# Altium footprint library Modules.PcbLib: 11 footprints
Each footprint in its own frame and in the unit in brackets; x right, y up, seen from the top. Pads: shape width x height; smd on the part's side, far side on the other; paste and mask are expansions set on the pad; w line width, h text height; cw(c..) or ccw(c..) is an arc to the next point about the centre after c.
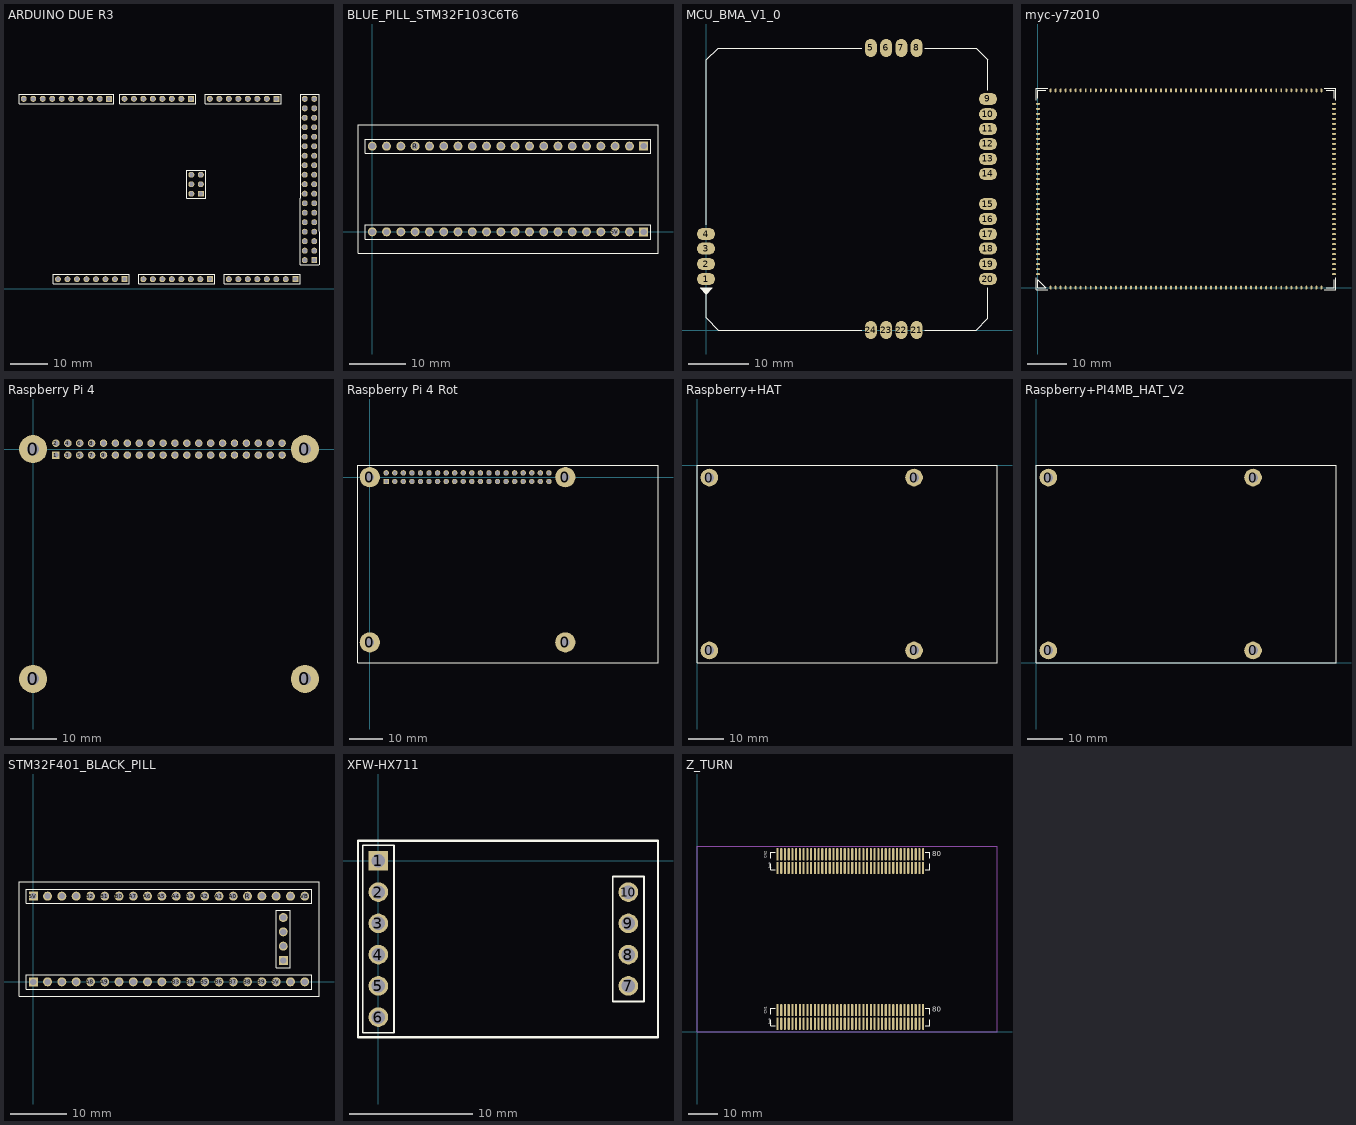
[diagram p0: the footprints below, top view; thin cyan lines are the x and y axes]

## ARDUINO DUE R3 [mm]
pads (92):
  rect 1.6x1.6 hole 1.1: 0(63.5,50.8) 8(41.656,50.8) 21(86.36,50.8) A7(68.58,2.54) CANTX(91.44,2.54) GND(66.167,25.4) GND(96.52,7.62) VIN(45.72,2.54)
  round 1.6 hole 1.1: 1(60.96,50.8) 2(58.42,50.8) 3(55.88,50.8) 3V3(35.56,2.54) 4(53.34,50.8) 5(50.8,50.8) 5V(38.1,2.54) 5V(66.167,30.48) 5V(93.98,50.8) 5V(96.52,50.8) 6(48.26,50.8) 7(45.72,50.8) 9(39.116,50.8) 10(36.576,50.8) 11(34.036,50.8) 12(31.496,50.8) 13(28.956,50.8) 14(68.58,50.8) 15(71.12,50.8) 16(73.66,50.8) 17(76.2,50.8) 18(78.74,50.8) 19(81.28,50.8) 20(83.82,50.8) 22(93.98,48.26) 23(96.52,48.26) 24(93.95,45.73) 25(96.49,45.73) 26(93.95,43.19) 27(96.49,43.19) 28(93.95,40.65) 29(96.49,40.65) 30(93.95,38.11) 31(96.49,38.11) 32(93.95,35.57) 33(96.49,35.57) 34(93.95,33.03) 35(96.49,33.03) 36(93.95,30.49) 37(96.49,30.49) 38(93.95,27.95) 39(96.49,27.95) 40(93.95,25.41) 41(96.49,25.41) 42(93.98,22.86) 43(96.52,22.86) 44(93.98,20.32) 45(96.52,20.32) 46(93.98,17.78) 47(96.52,17.78) 48(93.98,15.24) 49(96.52,15.24) 50(93.98,12.7) 51(96.52,12.7) 52(93.98,10.16) 53(96.52,10.16) A0(50.8,2.54) A1(53.34,2.54) A2(55.88,2.54) A3(58.42,2.54) A4(60.96,2.54) A5(63.5,2.54) A6(66.04,2.54) A8(73.66,2.54) A9(76.2,2.54) A10(78.74,2.54) A11(81.28,2.54) AREF(23.876,50.8) CANRX(88.9,2.54) DAC0(83.82,2.54) DAC1(86.36,2.54) GND(26.416,50.8) GND(40.64,2.54) GND(43.18,2.54) GND(93.98,7.62) IOREF(30.48,2.54) MISO(63.627,30.48) MOSI(66.167,27.94) NC(27.94,2.54) RESET(33.02,2.54) RESET(63.627,25.4) SCK(63.627,27.94) SCL1(18.796,50.8) SDA1(21.336,50.8)
Top Overlay:
  lines w0.15: 17.526,49.53 42.926,49.53 42.926,52.07 17.526,52.07 17.526,49.53 ; 26.67,1.27 26.67,3.81 46.99,3.81 46.99,1.27 26.67,1.27 ; 44.45,49.53 44.45,52.07 64.77,52.07 64.77,49.53 44.45,49.53 ; 49.53,1.27 49.53,3.81 69.85,3.81 69.85,1.27 49.53,1.27 ; 62.357,24.13 62.357,31.75 64.897,31.75 67.437,31.75 67.437,24.13 64.897,24.13 62.357,24.13 ; 67.31,49.53 67.31,52.07 87.63,52.07 87.63,49.53 67.31,49.53 ; 72.39,1.27 72.39,3.81 92.71,3.81 92.71,1.27 72.39,1.27 ; 92.71,6.35 97.79,6.35 97.79,24.13 97.79,41.91 97.79,52.07 92.71,52.07 92.71,41.91 92.71,24.13 92.71,6.35
Bottom Overlay:
  lines w0.15: 17.526,49.53 42.926,49.53 42.926,52.07 17.526,52.07 17.526,49.53 ; 26.67,1.27 46.99,1.27 46.99,3.81 26.67,3.81 26.67,1.27 ; 44.45,49.53 64.77,49.53 64.77,52.07 44.45,52.07 44.45,49.53 ; 49.53,1.27 69.85,1.27 69.85,3.81 49.53,3.81 49.53,1.27 ; 62.357,24.13 62.357,31.75 64.897,31.75 67.437,31.75 67.437,24.13 64.897,24.13 62.357,24.13 ; 67.31,49.53 87.63,49.53 87.63,52.07 67.31,52.07 67.31,49.53 ; 72.39,1.27 92.71,1.27 92.71,3.81 72.39,3.81 72.39,1.27 ; 92.71,6.35 97.79,6.35 97.79,24.13 97.79,41.91 97.79,52.07 92.71,52.07 92.71,41.91 92.71,24.13 92.71,6.35
3D body "User Library-DS1023.STEP": height 8.5, standoff -3, extent 64.897,24.13 67.437,26.67
3D body "User Library-DS1023.STEP": height 8.5, standoff -3, extent 64.897,26.67 67.437,29.21
3D body "User Library-DS1023.STEP": height 8.5, standoff -3, extent 64.897,29.21 67.437,31.75
3D body "User Library-DS1023.STEP": height 8.5, standoff -3, extent 62.357,24.13 64.897,26.67
3D body "User Library-DS1023.STEP": height 8.5, standoff -3, extent 62.357,26.67 64.897,29.21
3D body "User Library-DS1023.STEP": height 8.5, standoff -3, extent 62.357,29.21 64.897,31.75
3D body "User Library-ARDUINO DUE.STEP": height -1.4, standoff -16, extent -1.88,0 101.6,53.34
3D body "PLS-1.STEP": height 8.5, standoff -3, extent 67.31,49.53 69.85,52.07
3D body "PLS-1.STEP": height 8.5, standoff -3, extent 69.85,49.53 72.39,52.07
3D body "PLS-1.STEP": height 8.5, standoff -3, extent 72.39,49.53 74.93,52.07
3D body "PLS-1.STEP": height 8.5, standoff -3, extent 74.93,49.53 77.47,52.07
3D body "PLS-1.STEP": height 8.5, standoff -3, extent 77.47,49.53 80.01,52.07
3D body "PLS-1.STEP": height 8.5, standoff -3, extent 80.01,49.53 82.55,52.07
3D body "PLS-1.STEP": height 8.5, standoff -3, extent 82.55,49.53 85.09,52.07
3D body "PLS-1.STEP": height 8.5, standoff -3, extent 85.09,49.53 87.63,52.07
3D body "PLS-1.STEP": height 8.5, standoff -3, extent 26.67,1.27 29.21,3.81
3D body "PLS-1.STEP": height 8.5, standoff -3, extent 29.21,1.27 31.75,3.81
3D body "PLS-1.STEP": height 8.5, standoff -3, extent 31.75,1.27 34.29,3.81
3D body "PLS-1.STEP": height 8.5, standoff -3, extent 34.29,1.27 36.83,3.81
3D body "PLS-1.STEP": height 8.5, standoff -3, extent 36.83,1.27 39.37,3.81
3D body "PLS-1.STEP": height 8.5, standoff -3, extent 39.37,1.27 41.91,3.81
3D body "PLS-1.STEP": height 8.5, standoff -3, extent 41.91,1.27 44.45,3.81
3D body "PLS-1.STEP": height 8.5, standoff -3, extent 44.45,1.27 46.99,3.81
3D body "PLS-1.STEP": height 8.5, standoff -3, extent 44.45,49.53 46.99,52.07
3D body "PLS-1.STEP": height 8.5, standoff -3, extent 46.99,49.53 49.53,52.07
3D body "PLS-1.STEP": height 8.5, standoff -3, extent 49.53,49.53 52.07,52.07
3D body "PLS-1.STEP": height 8.5, standoff -3, extent 52.07,49.53 54.61,52.07
3D body "PLS-1.STEP": height 8.5, standoff -3, extent 54.61,49.53 57.15,52.07
3D body "PLS-1.STEP": height 8.5, standoff -3, extent 57.15,49.53 59.69,52.07
3D body "PLS-1.STEP": height 8.5, standoff -3, extent 59.69,49.53 62.23,52.07
3D body "PLS-1.STEP": height 8.5, standoff -3, extent 62.23,49.53 64.77,52.07
3D body "PLS-1.STEP": height 8.5, standoff -3, extent 49.53,1.27 52.07,3.81
3D body "PLS-1.STEP": height 8.5, standoff -3, extent 52.07,1.27 54.61,3.81
3D body "PLS-1.STEP": height 8.5, standoff -3, extent 54.61,1.27 57.15,3.81
3D body "PLS-1.STEP": height 8.5, standoff -3, extent 57.15,1.27 59.69,3.81
3D body "PLS-1.STEP": height 8.5, standoff -3, extent 59.69,1.27 62.23,3.81
3D body "PLS-1.STEP": height 8.5, standoff -3, extent 62.23,1.27 64.77,3.81
3D body "PLS-1.STEP": height 8.5, standoff -3, extent 64.77,1.27 67.31,3.81
3D body "PLS-1.STEP": height 8.5, standoff -3, extent 67.31,1.27 69.85,3.81
3D body "PLS-1.STEP": height 8.5, standoff -3, extent 72.39,1.27 74.93,3.81
3D body "PLS-1.STEP": height 8.5, standoff -3, extent 74.93,1.27 77.47,3.81
3D body "PLS-1.STEP": height 8.5, standoff -3, extent 77.47,1.27 80.01,3.81
3D body "PLS-1.STEP": height 8.5, standoff -3, extent 80.01,1.27 82.55,3.81
3D body "PLS-1.STEP": height 8.5, standoff -3, extent 82.55,1.27 85.09,3.81
3D body "PLS-1.STEP": height 8.5, standoff -3, extent 85.09,1.27 87.63,3.81
3D body "PLS-1.STEP": height 8.5, standoff -3, extent 87.63,1.27 90.17,3.81
3D body "PLS-1.STEP": height 8.5, standoff -3, extent 90.17,1.27 92.71,3.81
3D body "PLS-1.STEP": height 8.5, standoff -3, extent 92.71,39.37 95.25,41.91
3D body "PLS-1.STEP": height 8.5, standoff -3, extent 92.71,36.83 95.25,39.37
3D body "PLS-1.STEP": height 8.5, standoff -3, extent 92.71,34.29 95.25,36.83
3D body "PLS-1.STEP": height 8.5, standoff -3, extent 95.25,39.37 97.79,41.91
3D body "PLS-1.STEP": height 8.5, standoff -3, extent 95.25,36.83 97.79,39.37
3D body "PLS-1.STEP": height 8.5, standoff -3, extent 95.25,34.29 97.79,36.83
3D body "PLS-1.STEP": height 8.5, standoff -3, extent 92.71,49.53 95.25,52.07
3D body "PLS-1.STEP": height 8.5, standoff -3, extent 92.71,46.99 95.25,49.53
3D body "PLS-1.STEP": height 8.5, standoff -3, extent 92.71,44.45 95.25,46.99
3D body "PLS-1.STEP": height 8.5, standoff -3, extent 92.71,41.91 95.25,44.45
3D body "PLS-1.STEP": height 8.5, standoff -3, extent 95.25,49.53 97.79,52.07
3D body "PLS-1.STEP": height 8.5, standoff -3, extent 95.25,46.99 97.79,49.53
3D body "PLS-1.STEP": height 8.5, standoff -3, extent 95.25,44.45 97.79,46.99
3D body "PLS-1.STEP": height 8.5, standoff -3, extent 95.25,41.91 97.79,44.45
3D body "PLS-1.STEP": height 8.5, standoff -3, extent 92.74,24.12 95.28,26.66
3D body "PLS-1.STEP": height 8.5, standoff -3, extent 92.74,21.58 95.28,24.12
3D body "PLS-1.STEP": height 8.5, standoff -3, extent 92.74,19.04 95.28,21.58
3D body "PLS-1.STEP": height 8.5, standoff -3, extent 95.28,24.12 97.82,26.66
3D body "PLS-1.STEP": height 8.5, standoff -3, extent 95.28,21.58 97.82,24.12
3D body "PLS-1.STEP": height 8.5, standoff -3, extent 95.28,19.04 97.82,21.58
3D body "PLS-1.STEP": height 8.5, standoff -3, extent 92.74,31.74 95.28,34.28
3D body "PLS-1.STEP": height 8.5, standoff -3, extent 92.74,29.2 95.28,31.74
3D body "PLS-1.STEP": height 8.5, standoff -3, extent 92.74,26.66 95.28,29.2
3D body "PLS-1.STEP": height 8.5, standoff -3, extent 95.28,31.74 97.82,34.28
3D body "PLS-1.STEP": height 8.5, standoff -3, extent 95.28,29.2 97.82,31.74
3D body "PLS-1.STEP": height 8.5, standoff -3, extent 95.28,26.66 97.82,29.2
3D body "PLS-1.STEP": height 8.5, standoff -3, extent 92.77,16.49 95.31,19.03
3D body "PLS-1.STEP": height 8.5, standoff -3, extent 95.31,16.49 97.85,19.03
3D body "PLS-1.STEP": height 8.5, standoff -3, extent 92.77,13.95 95.31,16.49
3D body "PLS-1.STEP": height 8.5, standoff -3, extent 95.31,13.95 97.85,16.49
3D body "PLS-1.STEP": height 8.5, standoff -3, extent 92.74,11.42 95.28,13.96
3D body "PLS-1.STEP": height 8.5, standoff -3, extent 95.28,11.42 97.82,13.96
3D body "PLS-1.STEP": height 8.5, standoff -3, extent 92.74,8.88 95.28,11.42
3D body "PLS-1.STEP": height 8.5, standoff -3, extent 95.28,8.88 97.82,11.42
3D body "PLS-1.STEP": height 8.5, standoff -3, extent 92.74,6.34 95.28,8.88
3D body "PLS-1.STEP": height 8.5, standoff -3, extent 95.28,6.34 97.82,8.88
3D body "PLS-1.STEP": height 8.5, standoff -3, extent 17.526,49.53 20.066,52.07
3D body "PLS-1.STEP": height 8.5, standoff -3, extent 20.066,49.53 22.606,52.07
3D body "PLS-1.STEP": height 8.5, standoff -3, extent 22.606,49.53 25.146,52.07
3D body "PLS-1.STEP": height 8.5, standoff -3, extent 25.146,49.53 27.686,52.07
3D body "PLS-1.STEP": height 8.5, standoff -3, extent 27.686,49.53 30.226,52.07
3D body "PLS-1.STEP": height 8.5, standoff -3, extent 30.226,49.53 32.766,52.07
3D body "PLS-1.STEP": height 8.5, standoff -3, extent 32.766,49.53 35.306,52.07
3D body "PLS-1.STEP": height 8.5, standoff -3, extent 35.306,49.53 37.846,52.07
3D body "PLS-1.STEP": height 8.5, standoff -3, extent 37.846,49.53 40.386,52.07
3D body "PLS-1.STEP": height 8.5, standoff -3, extent 40.386,49.53 42.926,52.07

## BLUE_PILL_STM32F103C6T6 [mm]
pads (40):
  round 1.6 hole 1.1: 3V3(5.08,15.24) 5V(43.18,0) GND(0,15.24) GND(2.54,15.24) GND(45.72,0) PA0(38.1,15.24) PA1(35.56,15.24) PA2(33.02,15.24) PA3(30.48,15.24) PA4(27.94,15.24) PA5(25.4,15.24) PA6(22.86,15.24) PA7(20.32,15.24) PA8(10.16,0) PA9(12.7,0) PA10(15.24,0) PA11(17.78,0) PA12(20.32,0) PA15(22.86,0) PB0(17.78,15.24) PB1(15.24,15.24) PB3(25.4,0) PB4(27.94,0) PB5(30.48,0) PB6(33.02,0) PB7(35.56,0) PB8(38.1,0) PB9(40.64,0) PB10(12.7,15.24) PB11(10.16,15.24) PB12(0,0) PB13(2.54,0) PB14(5.08,0) PB15(7.62,0) PC13(45.72,15.24) PC14(43.18,15.24) PC15(40.64,15.24) R(7.62,15.24)
  rect 1.6x1.6 hole 1.1: 3V3(48.26,0) VBAT(48.26,15.24)
Top Overlay:
  lines w0.15: -1.27,-1.27 49.53,-1.27 49.53,1.27 -1.27,1.27 -1.27,-1.27 ; -1.27,13.97 49.53,13.97 49.53,16.51 -1.27,16.51 -1.27,13.97
  lines w0.2: -2.54,-3.81 50.8,-3.81 50.8,19.05 -2.54,19.05 -2.54,-3.81
3D body "YAAJ_BluePill.step": height 19.1, standoff 6.6, extent -2.37,-3.68 50.63,18.92
3D body "User Library-DS1023.STEP": height 8.5, standoff -3, extent 46.99,-1.27 49.53,1.27
3D body "User Library-DS1023.STEP": height 8.5, standoff -3, extent 44.45,-1.27 46.99,1.27
3D body "User Library-DS1023.STEP": height 8.5, standoff -3, extent 41.91,-1.27 44.45,1.27
3D body "User Library-DS1023.STEP": height 8.5, standoff -3, extent 39.37,-1.27 41.91,1.27
3D body "User Library-DS1023.STEP": height 8.5, standoff -3, extent 36.83,-1.27 39.37,1.27
3D body "User Library-DS1023.STEP": height 8.5, standoff -3, extent 34.29,-1.27 36.83,1.27
3D body "User Library-DS1023.STEP": height 8.5, standoff -3, extent 31.75,-1.27 34.29,1.27
3D body "User Library-DS1023.STEP": height 8.5, standoff -3, extent 29.21,-1.27 31.75,1.27
3D body "User Library-DS1023.STEP": height 8.5, standoff -3, extent 26.67,-1.27 29.21,1.27
3D body "User Library-DS1023.STEP": height 8.5, standoff -3, extent 24.13,-1.27 26.67,1.27
3D body "User Library-DS1023.STEP": height 8.5, standoff -3, extent 21.59,-1.27 24.13,1.27
3D body "User Library-DS1023.STEP": height 8.5, standoff -3, extent 19.05,-1.27 21.59,1.27
3D body "User Library-DS1023.STEP": height 8.5, standoff -3, extent 16.51,-1.27 19.05,1.27
3D body "User Library-DS1023.STEP": height 8.5, standoff -3, extent 13.97,-1.27 16.51,1.27
3D body "User Library-DS1023.STEP": height 8.5, standoff -3, extent 11.43,-1.27 13.97,1.27
3D body "User Library-DS1023.STEP": height 8.5, standoff -3, extent 8.89,-1.27 11.43,1.27
3D body "User Library-DS1023.STEP": height 8.5, standoff -3, extent 6.35,-1.27 8.89,1.27
3D body "User Library-DS1023.STEP": height 8.5, standoff -3, extent 3.81,-1.27 6.35,1.27
3D body "User Library-DS1023.STEP": height 8.5, standoff -3, extent 1.27,-1.27 3.81,1.27
3D body "User Library-DS1023.STEP": height 8.5, standoff -3, extent -1.27,-1.27 1.27,1.27
3D body "User Library-DS1023.STEP": height 8.5, standoff -3, extent 46.99,13.97 49.53,16.51
3D body "User Library-DS1023.STEP": height 8.5, standoff -3, extent 44.45,13.97 46.99,16.51
3D body "User Library-DS1023.STEP": height 8.5, standoff -3, extent 41.91,13.97 44.45,16.51
3D body "User Library-DS1023.STEP": height 8.5, standoff -3, extent 39.37,13.97 41.91,16.51
3D body "User Library-DS1023.STEP": height 8.5, standoff -3, extent 36.83,13.97 39.37,16.51
3D body "User Library-DS1023.STEP": height 8.5, standoff -3, extent 34.29,13.97 36.83,16.51
3D body "User Library-DS1023.STEP": height 8.5, standoff -3, extent 31.75,13.97 34.29,16.51
3D body "User Library-DS1023.STEP": height 8.5, standoff -3, extent 29.21,13.97 31.75,16.51
3D body "User Library-DS1023.STEP": height 8.5, standoff -3, extent 26.67,13.97 29.21,16.51
3D body "User Library-DS1023.STEP": height 8.5, standoff -3, extent 24.13,13.97 26.67,16.51
3D body "User Library-DS1023.STEP": height 8.5, standoff -3, extent 21.59,13.97 24.13,16.51
3D body "User Library-DS1023.STEP": height 8.5, standoff -3, extent 19.05,13.97 21.59,16.51
3D body "User Library-DS1023.STEP": height 8.5, standoff -3, extent 16.51,13.97 19.05,16.51
3D body "User Library-DS1023.STEP": height 8.5, standoff -3, extent 13.97,13.97 16.51,16.51
3D body "User Library-DS1023.STEP": height 8.5, standoff -3, extent 11.43,13.97 13.97,16.51
3D body "User Library-DS1023.STEP": height 8.5, standoff -3, extent 8.89,13.97 11.43,16.51
3D body "User Library-DS1023.STEP": height 8.5, standoff -3, extent 6.35,13.97 8.89,16.51
3D body "User Library-DS1023.STEP": height 8.5, standoff -3, extent 3.81,13.97 6.35,16.51
3D body "User Library-DS1023.STEP": height 8.5, standoff -3, extent 1.27,13.97 3.81,16.51
3D body "User Library-DS1023.STEP": height 8.5, standoff -3, extent -1.27,13.97 1.27,16.51

## MCU_BMA_V1_0 [mm]
pads (24):
  oval 3x2 smd: 1(0,8.5) 2(0,11) 3(0,13.58) 4(0,16) 9(47,38.5) 10(47,35.96) 11(47,33.5) 12(47,31) 13(47,28.5) 14(47,26) 15(47,21) 16(47,18.5) 17(47,16) 18(47,13.58) 19(47,11) 20(47,8.5)
  oval 2x3 smd: 5(27.48,47) 6(30.02,47) 7(32.56,47) 8(35.1,47) 21(35.1,0) 22(32.56,0) 23(30.02,0) 24(27.48,0)
Top Overlay:
  region: -1,7 1,7 0,6
  lines w0.2: 0,17.5 0,45 2,47 26,47 ; 26,0 2,0 0,2 0,6 ; 36.5,0 45,0 47,2 47,7 ; 36.5,47 45,47 47,45 47,40 ; 0,6 -1,7 1,7 0,6
3D body "MCU_BMA_V1_0_SMT.STEP": height 5.9, standoff 0.01, extent 0,0 47,47

## myc-y7z010 [mm]
pads (180):
  oval 0.5x1 smd: A1(3.21,0) A2(4.48,0) A3(5.75,0) A4(7.02,0) A5(8.29,0) A6(9.56,0) A7(10.83,0) A8(12.1,0) A9(13.37,0) A10(14.64,0) A11(15.91,0) A12(17.18,0) A13(18.45,0) A14(19.72,0) A15(20.99,0) A16(22.26,0) A17(23.53,0) A18(24.8,0) A19(26.07,0) A20(27.34,0) A21(28.61,0) A22(29.88,0) A23(31.15,0) A24(32.42,0) A25(33.69,0) A26(34.96,0) A27(36.23,0) A28(37.5,0) A29(38.77,0) A30(40.04,0) A31(41.31,0) A32(42.58,0) A33(43.85,0) A34(45.12,0) A35(46.39,0) A36(47.66,0) A37(48.93,0) A38(50.2,0) A39(51.47,0) A40(52.74,0) A41(54.01,0) A42(55.28,0) A43(56.55,0) A44(57.82,0) A45(59.09,0) A46(60.36,0) A47(61.63,0) A48(62.9,0) A49(64.17,0) A50(65.44,0) A51(66.71,0) A52(67.98,0) A53(69.25,0) A54(70.52,0) A55(71.79,0) C1(71.79,50) C2(70.52,50) C3(69.25,50) C4(67.98,50) C5(66.71,50) C6(65.44,50) C7(64.17,50) C8(62.9,50) C9(61.63,50) C10(60.36,50) C11(59.09,50) C12(57.82,50) C13(56.55,50) C14(55.28,50) C15(54.01,50) C16(52.74,50) C17(51.47,50) C18(50.2,50) C19(48.93,50) C20(47.66,50) C21(46.39,50) C22(45.12,50) C23(43.85,50) C24(42.58,50) C25(41.31,50) C26(40.04,50) C27(38.77,50) C28(37.5,50) C29(36.23,50) C30(34.96,50) C31(33.69,50) C32(32.42,50) C33(31.15,50) C34(29.88,50) C35(28.61,50) C36(27.34,50) C37(26.07,50) C38(24.8,50) C39(23.53,50) C40(22.26,50) C41(20.99,50) C42(19.72,50) C43(18.45,50) C44(17.18,50) C45(15.91,50) C46(14.64,50) C47(13.37,50) C48(12.1,50) C49(10.83,50) C50(9.56,50) C51(8.29,50) C52(7.02,50) C53(5.75,50) C54(4.48,50) C55(3.21,50)
  oval 1x0.5 smd: B1(75,3.41) B2(75,4.68) B3(75,5.95) B4(75,7.22) B5(75,8.49) B6(75,9.76) B7(75,11.03) B8(75,12.3) B9(75,13.57) B10(75,14.84) B11(75,16.11) B12(75,17.38) B13(75,18.65) B14(75,19.92) B15(75,21.19) B16(75,22.46) B17(75,23.73) B18(75,25) B19(75,26.27) B20(75,27.54) B21(75,28.81) B22(75,30.08) B23(75,31.35) B24(75,32.62) B25(75,33.89) B26(75,35.16) B27(75,36.43) B28(75,37.7) B29(75,38.97) B30(75,40.24) B31(75,41.51) B32(75,42.78) B33(75,44.05) B34(75,45.32) B35(75,46.59) D1(0,46.59) D2(0,45.32) D3(0,44.05) D4(0,42.78) D5(0,41.51) D6(0,40.24) D7(0,38.97) D8(0,37.7) D9(0,36.43) D10(0,35.16) D11(0,33.89) D12(0,32.62) D13(0,31.35) D14(0,30.08) D15(0,28.81) D16(0,27.54) D17(0,26.27) D18(0,25) D19(0,23.73) D20(0,22.46) D21(0,21.19) D22(0,19.92) D23(0,18.65) D24(0,17.38) D25(0,16.11) D26(0,14.84) D27(0,13.57) D28(0,12.3) D29(0,11.03) D30(0,9.76) D31(0,8.49) D32(0,7.22) D33(0,5.95) D34(0,4.68) D35(0,3.41)
Top Overlay:
  lines w0.2: -0.5,2.5 -0.5,-0.5 2.5,-0.5 ; -0.5,47.5 -0.5,50.5 2.5,50.5 ; 0,48 0,50 2,50 ; 72.5,-0.5 75.5,-0.5 75.5,2.5 ; 72.5,50.5 75.5,50.5 75.5,47.5 ; 73,0 75,0 75,2 ; 73,50 75,50 75,48 ; 0,0 2,0 0,2 0,0
3D body: height 0.94, standoff 0, extent 0,0 75,50

## Raspberry Pi 4 [mm]
pads (44):
  round 6 hole 2.6: 0(0,-49) 0(0,0) 0(58,-49) 0(58,0)
  rect 1.6x1.6 hole 1.1: 1(4.87,-1.27)
  round 1.6 hole 1.1: 2(4.87,1.27) 3(7.41,-1.27) 4(7.41,1.27) 5(9.95,-1.27) 6(9.95,1.27) 7(12.49,-1.27) 8(12.49,1.27) 9(15.03,-1.27) 10(15.03,1.27) 11(17.57,-1.27) 12(17.57,1.27) 13(20.11,-1.27) 14(20.11,1.27) 15(22.65,-1.27) 16(22.65,1.27) 17(25.19,-1.27) 18(25.19,1.27) 19(27.73,-1.27) 20(27.73,1.27) 21(30.27,-1.27) 22(30.27,1.27) 23(32.81,-1.27) 24(32.81,1.27) 25(35.35,-1.27) 26(35.35,1.27) 27(37.89,-1.27) 28(37.89,1.27) 29(40.43,-1.27) 30(40.43,1.27) 31(42.97,-1.27) 32(42.97,1.27) 33(45.51,-1.27) 34(45.51,1.27) 35(48.05,-1.27) 36(48.05,1.27) 37(50.59,-1.27) 38(50.59,1.27) 39(53.13,-1.27) 40(53.13,1.27)
3D body "User Library-DS1023.STEP": height 1.4, standoff -10.1, extent 16.3,0 18.84,2.54
3D body "User Library-DS1023.STEP": height 1.4, standoff -10.1, extent 16.3,-2.54 18.84,0
3D body "User Library-DS1023.STEP": height 1.4, standoff -10.1, extent 26.46,0 29,2.54
3D body "User Library-DS1023.STEP": height 1.4, standoff -10.1, extent 26.46,-2.54 29,0
3D body "User Library-DS1023.STEP": height 1.4, standoff -10.1, extent 23.92,0 26.46,2.54
3D body "User Library-DS1023.STEP": height 1.4, standoff -10.1, extent 23.92,-2.54 26.46,0
3D body "User Library-DS1023.STEP": height 1.4, standoff -10.1, extent 21.38,0 23.92,2.54
3D body "User Library-DS1023.STEP": height 1.4, standoff -10.1, extent 21.38,-2.54 23.92,0
3D body "User Library-DS1023.STEP": height 1.4, standoff -10.1, extent 18.84,0 21.38,2.54
3D body "User Library-DS1023.STEP": height 1.4, standoff -10.1, extent 18.84,-2.54 21.38,0
3D body "User Library-DS1023.STEP": height 1.4, standoff -10.1, extent 13.76,-2.54 16.3,0
3D body "User Library-DS1023.STEP": height 1.4, standoff -10.1, extent 13.76,0 16.3,2.54
3D body "User Library-DS1023.STEP": height 1.4, standoff -10.1, extent 3.6,-2.54 6.14,0
3D body "User Library-DS1023.STEP": height 1.4, standoff -10.1, extent 3.6,0 6.14,2.54
3D body "User Library-DS1023.STEP": height 1.4, standoff -10.1, extent 6.14,-2.54 8.68,0
3D body "User Library-DS1023.STEP": height 1.4, standoff -10.1, extent 6.14,0 8.68,2.54
3D body "User Library-DS1023.STEP": height 1.4, standoff -10.1, extent 8.68,-2.54 11.22,0
3D body "User Library-DS1023.STEP": height 1.4, standoff -10.1, extent 8.68,0 11.22,2.54
3D body "User Library-DS1023.STEP": height 1.4, standoff -10.1, extent 11.22,-2.54 13.76,0
3D body "User Library-DS1023.STEP": height 1.4, standoff -10.1, extent 11.22,0 13.76,2.54
3D body "User Library-DS1023.STEP": height 1.4, standoff -10.1, extent 39.16,-2.54 41.7,0
3D body "User Library-DS1023.STEP": height 1.4, standoff -10.1, extent 39.16,0 41.7,2.54
3D body "User Library-DS1023.STEP": height 1.4, standoff -10.1, extent 29,-2.54 31.54,0
3D body "User Library-DS1023.STEP": height 1.4, standoff -10.1, extent 29,0 31.54,2.54
3D body "User Library-DS1023.STEP": height 1.4, standoff -10.1, extent 31.54,-2.54 34.08,0
3D body "User Library-DS1023.STEP": height 1.4, standoff -10.1, extent 31.54,0 34.08,2.54
3D body "User Library-DS1023.STEP": height 1.4, standoff -10.1, extent 34.08,-2.54 36.62,0
3D body "User Library-DS1023.STEP": height 1.4, standoff -10.1, extent 34.08,0 36.62,2.54
3D body "User Library-DS1023.STEP": height 1.4, standoff -10.1, extent 36.62,-2.54 39.16,0
3D body "User Library-DS1023.STEP": height 1.4, standoff -10.1, extent 36.62,0 39.16,2.54
3D body "User Library-DS1023.STEP": height 1.4, standoff -10.1, extent 41.7,0 44.24,2.54
3D body "User Library-DS1023.STEP": height 1.4, standoff -10.1, extent 41.7,-2.54 44.24,0
3D body "User Library-DS1023.STEP": height 1.4, standoff -10.1, extent 51.86,0 54.4,2.54
3D body "User Library-DS1023.STEP": height 1.4, standoff -10.1, extent 51.86,-2.54 54.4,0
3D body "User Library-DS1023.STEP": height 1.4, standoff -10.1, extent 49.32,0 51.86,2.54
3D body "User Library-DS1023.STEP": height 1.4, standoff -10.1, extent 49.32,-2.54 51.86,0
3D body "User Library-DS1023.STEP": height 1.4, standoff -10.1, extent 46.78,0 49.32,2.54
3D body "User Library-DS1023.STEP": height 1.4, standoff -10.1, extent 46.78,-2.54 49.32,0
3D body "User Library-DS1023.STEP": height 1.4, standoff -10.1, extent 44.24,0 46.78,2.54
3D body "User Library-DS1023.STEP": height 1.4, standoff -10.1, extent 44.24,-2.54 46.78,0
3D body "Assembly Raspberry Pi 4 Model B step.STEP": height 4.44, standoff -16.4, extent -3.5,-54.95 85.57,3.5

## Raspberry Pi 4 Rot [mm]
pads (44):
  round 6 hole 2.6: 0(0,-49) 0(0,0) 0(58,-49) 0(58,0)
  rect 1.6x1.6 hole 1.1: 1(4.87,-1.27)
  round 1.6 hole 1.1: 2(4.87,1.27) 3(7.41,-1.27) 4(7.41,1.27) 5(9.95,-1.27) 6(9.95,1.27) 7(12.49,-1.27) 8(12.49,1.27) 9(15.03,-1.27) 10(15.03,1.27) 11(17.57,-1.27) 12(17.57,1.27) 13(20.11,-1.27) 14(20.11,1.27) 15(22.65,-1.27) 16(22.65,1.27) 17(25.19,-1.27) 18(25.19,1.27) 19(27.73,-1.27) 20(27.73,1.27) 21(30.27,-1.27) 22(30.27,1.27) 23(32.81,-1.27) 24(32.81,1.27) 25(35.35,-1.27) 26(35.35,1.27) 27(37.89,-1.27) 28(37.89,1.27) 29(40.43,-1.27) 30(40.43,1.27) 31(42.97,-1.27) 32(42.97,1.27) 33(45.51,-1.27) 34(45.51,1.27) 35(48.05,-1.27) 36(48.05,1.27) 37(50.59,-1.27) 38(50.59,1.27) 39(53.13,-1.27) 40(53.13,1.27)
Top Overlay:
  lines w0.2: -3.5,-55 85.5,-55 85.5,3.5 -3.5,3.5 -3.5,-55
3D body "Assembly Raspberry Pi 4 Model B step.STEP": height 29.94, standoff 9.1, extent -3.5,-54.95 85.57,3.5
3D body "User Library-DS1023.STEP": height 8.5, standoff -3, extent 44.24,-2.54 46.78,0
3D body "User Library-DS1023.STEP": height 8.5, standoff -3, extent 44.24,0 46.78,2.54
3D body "User Library-DS1023.STEP": height 8.5, standoff -3, extent 46.78,-2.54 49.32,0
3D body "User Library-DS1023.STEP": height 8.5, standoff -3, extent 46.78,0 49.32,2.54
3D body "User Library-DS1023.STEP": height 8.5, standoff -3, extent 49.32,-2.54 51.86,0
3D body "User Library-DS1023.STEP": height 8.5, standoff -3, extent 49.32,0 51.86,2.54
3D body "User Library-DS1023.STEP": height 8.5, standoff -3, extent 51.86,-2.54 54.4,0
3D body "User Library-DS1023.STEP": height 8.5, standoff -3, extent 51.86,0 54.4,2.54
3D body "User Library-DS1023.STEP": height 8.5, standoff -3, extent 41.7,-2.54 44.24,0
3D body "User Library-DS1023.STEP": height 8.5, standoff -3, extent 41.7,0 44.24,2.54
3D body "User Library-DS1023.STEP": height 8.5, standoff -3, extent 36.62,0 39.16,2.54
3D body "User Library-DS1023.STEP": height 8.5, standoff -3, extent 36.62,-2.54 39.16,0
3D body "User Library-DS1023.STEP": height 8.5, standoff -3, extent 34.08,0 36.62,2.54
3D body "User Library-DS1023.STEP": height 8.5, standoff -3, extent 34.08,-2.54 36.62,0
3D body "User Library-DS1023.STEP": height 8.5, standoff -3, extent 31.54,0 34.08,2.54
3D body "User Library-DS1023.STEP": height 8.5, standoff -3, extent 31.54,-2.54 34.08,0
3D body "User Library-DS1023.STEP": height 8.5, standoff -3, extent 29,0 31.54,2.54
3D body "User Library-DS1023.STEP": height 8.5, standoff -3, extent 29,-2.54 31.54,0
3D body "User Library-DS1023.STEP": height 8.5, standoff -3, extent 39.16,0 41.7,2.54
3D body "User Library-DS1023.STEP": height 8.5, standoff -3, extent 39.16,-2.54 41.7,0
3D body "User Library-DS1023.STEP": height 8.5, standoff -3, extent 11.22,0 13.76,2.54
3D body "User Library-DS1023.STEP": height 8.5, standoff -3, extent 11.22,-2.54 13.76,0
3D body "User Library-DS1023.STEP": height 8.5, standoff -3, extent 8.68,0 11.22,2.54
3D body "User Library-DS1023.STEP": height 8.5, standoff -3, extent 8.68,-2.54 11.22,0
3D body "User Library-DS1023.STEP": height 8.5, standoff -3, extent 6.14,0 8.68,2.54
3D body "User Library-DS1023.STEP": height 8.5, standoff -3, extent 6.14,-2.54 8.68,0
3D body "User Library-DS1023.STEP": height 8.5, standoff -3, extent 3.6,0 6.14,2.54
3D body "User Library-DS1023.STEP": height 8.5, standoff -3, extent 3.6,-2.54 6.14,0
3D body "User Library-DS1023.STEP": height 8.5, standoff -3, extent 13.76,0 16.3,2.54
3D body "User Library-DS1023.STEP": height 8.5, standoff -3, extent 13.76,-2.54 16.3,0
3D body "User Library-DS1023.STEP": height 8.5, standoff -3, extent 18.84,-2.54 21.38,0
3D body "User Library-DS1023.STEP": height 8.5, standoff -3, extent 18.84,0 21.38,2.54
3D body "User Library-DS1023.STEP": height 8.5, standoff -3, extent 21.38,-2.54 23.92,0
3D body "User Library-DS1023.STEP": height 8.5, standoff -3, extent 21.38,0 23.92,2.54
3D body "User Library-DS1023.STEP": height 8.5, standoff -3, extent 23.92,-2.54 26.46,0
3D body "User Library-DS1023.STEP": height 8.5, standoff -3, extent 23.92,0 26.46,2.54
3D body "User Library-DS1023.STEP": height 8.5, standoff -3, extent 26.46,-2.54 29,0
3D body "User Library-DS1023.STEP": height 8.5, standoff -3, extent 26.46,0 29,2.54
3D body "User Library-DS1023.STEP": height 8.5, standoff -3, extent 16.3,-2.54 18.84,0
3D body "User Library-DS1023.STEP": height 8.5, standoff -3, extent 16.3,0 18.84,2.54

## Raspberry+HAT [mm]
pads (4):
  round 5 hole 2.7: 0(3.5,-52.5) 0(3.5,-3.5) 0(61.5,-52.5) 0(61.5,-3.5)
Top Overlay:
  lines w0.2: 0,-56 0,0 85,0 85,-56 0,-56
3D body "Raspberry+HAT.STEP": height 30.29, standoff 0, extent 0,-58.45 89.07,0

## Raspberry+PI4MB_HAT_V2 [mm]
pads (4):
  round 5 hole 2.7: 0(3.5,3.5) 0(3.5,52.5) 0(61.5,3.5) 0(61.5,52.5)
Top Overlay:
  lines w0.2: 0,0 85,0 85,56 0,56 0,0
3D body "PI4MB_HAT_V2_0.step": height 30.5, standoff 4.1, extent 0,-2.45 89.07,56

## STM32F401_BLACK_PILL [mm]
pads (44):
  round 1.6 hole 1.1: 3V3(5.08,15.24) 3V3(48.26,0) 5V(43.18,0) A0(35.56,15.24) A1(33.02,15.24) A2(30.48,15.24) A3(27.94,15.24) A4(25.4,15.24) A5(22.86,15.24) A6(20.32,15.24) A7(17.78,15.24) A8(10.16,0) A9(12.7,0) A10(15.24,0) A11(17.78,0) A12(20.32,0) A15(22.86,0) B0(15.24,15.24) B1(12.7,15.24) B2(10.16,15.24) B3(25.4,0) B4(27.94,0) B5(30.48,0) B6(33.02,0) B7(35.56,0) B8(38.1,0) B9(40.64,0) B10(7.62,15.24) B13(2.54,0) B14(5.08,0) B15(7.62,0) C13(45.72,15.24) C14(43.18,15.24) C15(40.64,15.24) GND(2.54,15.24) GND(44.45,11.43) GND(45.72,0) R(38.1,15.24) SWDIO(44.45,6.35) SWSCK(44.45,8.89) VB(48.26,15.24)
  rect 1.6x1.6 hole 1.1: 3V3(44.45,3.81) 5V(0,15.24) B12(0,0)
Top Overlay:
  lines w0.15: -1.27,-1.27 -1.27,1.27 49.53,1.27 49.53,-1.27 -1.27,-1.27 ; -1.27,13.97 -1.27,16.51 49.53,16.51 49.53,13.97 -1.27,13.97 ; 43.18,2.54 45.72,2.54 45.72,12.7 43.18,12.7 43.18,2.54
  lines w0.2: -2.54,-2.54 -2.54,17.78 50.8,17.78 50.8,-2.54 -2.54,-2.54
3D body "User Library-DS1023.STEP": height 8.5, standoff -3, extent -1.27,13.97 1.27,16.51
3D body "User Library-DS1023.STEP": height 8.5, standoff -3, extent 1.27,13.97 3.81,16.51
3D body "User Library-DS1023.STEP": height 8.5, standoff -3, extent 3.81,13.97 6.35,16.51
3D body "User Library-DS1023.STEP": height 8.5, standoff -3, extent 6.35,13.97 8.89,16.51
3D body "User Library-DS1023.STEP": height 8.5, standoff -3, extent 8.89,13.97 11.43,16.51
3D body "User Library-DS1023.STEP": height 8.5, standoff -3, extent 11.43,13.97 13.97,16.51
3D body "User Library-DS1023.STEP": height 8.5, standoff -3, extent 13.97,13.97 16.51,16.51
3D body "User Library-DS1023.STEP": height 8.5, standoff -3, extent 16.51,13.97 19.05,16.51
3D body "User Library-DS1023.STEP": height 8.5, standoff -3, extent 19.05,13.97 21.59,16.51
3D body "User Library-DS1023.STEP": height 8.5, standoff -3, extent 21.59,13.97 24.13,16.51
3D body "User Library-DS1023.STEP": height 8.5, standoff -3, extent 24.13,13.97 26.67,16.51
3D body "User Library-DS1023.STEP": height 8.5, standoff -3, extent 26.67,13.97 29.21,16.51
3D body "User Library-DS1023.STEP": height 8.5, standoff -3, extent 29.21,13.97 31.75,16.51
3D body "User Library-DS1023.STEP": height 8.5, standoff -3, extent 31.75,13.97 34.29,16.51
3D body "User Library-DS1023.STEP": height 8.5, standoff -3, extent 34.29,13.97 36.83,16.51
3D body "User Library-DS1023.STEP": height 8.5, standoff -3, extent 36.83,13.97 39.37,16.51
3D body "User Library-DS1023.STEP": height 8.5, standoff -3, extent 39.37,13.97 41.91,16.51
3D body "User Library-DS1023.STEP": height 8.5, standoff -3, extent 41.91,13.97 44.45,16.51
3D body "User Library-DS1023.STEP": height 8.5, standoff -3, extent 44.45,13.97 46.99,16.51
3D body "User Library-DS1023.STEP": height 8.5, standoff -3, extent 46.99,13.97 49.53,16.51
3D body "User Library-DS1023.STEP": height 8.5, standoff -3, extent 43.18,2.54 45.72,5.08
3D body "User Library-DS1023.STEP": height 8.5, standoff -3, extent 43.18,5.08 45.72,7.62
3D body "User Library-DS1023.STEP": height 8.5, standoff -3, extent 43.18,7.62 45.72,10.16
3D body "User Library-DS1023.STEP": height 8.5, standoff -3, extent 43.18,10.16 45.72,12.7
3D body "User Library-DS1023.STEP": height 8.5, standoff -3, extent -1.27,-1.27 1.27,1.27
3D body "User Library-DS1023.STEP": height 8.5, standoff -3, extent 1.27,-1.27 3.81,1.27
3D body "User Library-DS1023.STEP": height 8.5, standoff -3, extent 3.81,-1.27 6.35,1.27
3D body "User Library-DS1023.STEP": height 8.5, standoff -3, extent 6.35,-1.27 8.89,1.27
3D body "User Library-DS1023.STEP": height 8.5, standoff -3, extent 8.89,-1.27 11.43,1.27
3D body "User Library-DS1023.STEP": height 8.5, standoff -3, extent 11.43,-1.27 13.97,1.27
3D body "User Library-DS1023.STEP": height 8.5, standoff -3, extent 13.97,-1.27 16.51,1.27
3D body "User Library-DS1023.STEP": height 8.5, standoff -3, extent 16.51,-1.27 19.05,1.27
3D body "User Library-DS1023.STEP": height 8.5, standoff -3, extent 19.05,-1.27 21.59,1.27
3D body "User Library-DS1023.STEP": height 8.5, standoff -3, extent 21.59,-1.27 24.13,1.27
3D body "User Library-DS1023.STEP": height 8.5, standoff -3, extent 24.13,-1.27 26.67,1.27
3D body "User Library-DS1023.STEP": height 8.5, standoff -3, extent 26.67,-1.27 29.21,1.27
3D body "User Library-DS1023.STEP": height 8.5, standoff -3, extent 29.21,-1.27 31.75,1.27
3D body "User Library-DS1023.STEP": height 8.5, standoff -3, extent 31.75,-1.27 34.29,1.27
3D body "User Library-DS1023.STEP": height 8.5, standoff -3, extent 34.29,-1.27 36.83,1.27
3D body "User Library-DS1023.STEP": height 8.5, standoff -3, extent 36.83,-1.27 39.37,1.27
3D body "User Library-DS1023.STEP": height 8.5, standoff -3, extent 39.37,-1.27 41.91,1.27
3D body "User Library-DS1023.STEP": height 8.5, standoff -3, extent 41.91,-1.27 44.45,1.27
3D body "User Library-DS1023.STEP": height 8.5, standoff -3, extent 44.45,-1.27 46.99,1.27
3D body "User Library-DS1023.STEP": height 8.5, standoff -3, extent 46.99,-1.27 49.53,1.27

## XFW-HX711 [mm]
pads (10):
  rect 1.6x1.6 hole 1.1: 1(0,0)
  round 1.6 hole 1.1: 2(0,-2.54) 3(0,-5.08) 4(0,-7.62) 5(0,-10.16) 6(0,-12.7) 7(20.32,-10.16) 8(20.32,-7.62) 9(20.32,-5.08) 10(20.32,-2.54)
Top Overlay:
  lines w0.15: -1.27,-13.97 1.27,-13.97 1.27,-8.89 1.27,1.27 -1.27,1.27 -1.27,-8.89 -1.27,-13.97 ; 19.05,-11.43 21.59,-11.43 21.59,-1.27 19.05,-1.27 19.05,-11.43
  lines w0.2: -1.651,-14.351 -1.651,1.651 22.733,1.651 22.733,-14.351 -1.651,-14.351
3D body "User Library-DS1023.STEP": height 8.5, standoff -3, extent 19.05,-3.81 21.59,-1.27
3D body "User Library-DS1023.STEP": height 8.5, standoff -3, extent 19.05,-6.35 21.59,-3.81
3D body "User Library-DS1023.STEP": height 8.5, standoff -3, extent 19.05,-8.89 21.59,-6.35
3D body "User Library-DS1023.STEP": height 8.5, standoff -3, extent 19.05,-11.43 21.59,-8.89
3D body "User Library-DS1023.STEP": height 8.5, standoff -3, extent -1.27,-13.97 1.27,-11.43
3D body "User Library-DS1023.STEP": height 8.5, standoff -3, extent -1.27,-11.43 1.27,-8.89
3D body "User Library-DS1023.STEP": height 8.5, standoff -3, extent -1.27,-8.89 1.27,-6.35
3D body "User Library-DS1023.STEP": height 8.5, standoff -3, extent -1.27,-6.35 1.27,-3.81
3D body "User Library-DS1023.STEP": height 8.5, standoff -3, extent -1.27,-3.81 1.27,-1.27
3D body "User Library-DS1023.STEP": height 8.5, standoff -3, extent -1.27,-1.27 1.27,1.27

## Z_TURN [mm]
pads (160):
  rrect50% 0.73x4.11 smd: CN1_1(27.365,7.31) CN1_2(27.365,2.69) CN1_3(28.635,7.31) CN1_4(28.635,2.69) CN1_5(29.905,7.31) CN1_6(29.905,2.69) CN1_7(31.175,7.31) CN1_8(31.175,2.69) CN1_9(32.445,7.31) CN1_10(32.445,2.69) CN1_11(33.715,7.31) CN1_12(33.715,2.69) CN1_13(34.985,7.31) CN1_14(34.985,2.69) CN1_15(36.255,7.31) CN1_16(36.255,2.69) CN1_17(37.525,7.31) CN1_18(37.525,2.69) CN1_19(38.795,7.31) CN1_20(38.795,2.69) CN1_21(40.065,7.31) CN1_22(40.065,2.69) CN1_23(41.335,7.31) CN1_24(41.335,2.69) CN1_25(42.605,7.31) CN1_26(42.605,2.69) CN1_27(43.875,7.31) CN1_28(43.875,2.69) CN1_29(45.145,7.31) CN1_30(45.145,2.69) CN1_31(46.415,7.31) CN1_32(46.415,2.69) CN1_33(47.685,7.31) CN1_34(47.685,2.69) CN1_35(48.955,7.31) CN1_36(48.955,2.69) CN1_37(50.225,7.31) CN1_38(50.225,2.69) CN1_39(51.495,7.31) CN1_40(51.495,2.69) CN1_41(52.765,7.31) CN1_42(52.765,2.69) CN1_43(54.035,7.31) CN1_44(54.035,2.69) CN1_45(55.305,7.31) CN1_46(55.305,2.69) CN1_47(56.575,7.31) CN1_48(56.575,2.69) CN1_49(57.845,7.31) CN1_50(57.845,2.69) CN1_51(59.115,7.31) CN1_52(59.115,2.69) CN1_53(60.385,7.31) CN1_54(60.385,2.69) CN1_55(61.655,7.31) CN1_56(61.655,2.69) CN1_57(62.925,7.31) CN1_58(62.925,2.69) CN1_59(64.195,7.31) CN1_60(64.195,2.69) CN1_61(65.465,7.31) CN1_62(65.465,2.69) CN1_63(66.735,7.31) CN1_64(66.735,2.69) CN1_65(68.005,7.31) CN1_66(68.005,2.69) CN1_67(69.275,7.31) CN1_68(69.275,2.69) CN1_69(70.545,7.31) CN1_70(70.545,2.69) CN1_71(71.815,7.31) CN1_72(71.815,2.69) CN1_73(73.085,7.31) CN1_74(73.085,2.69) CN1_75(74.355,7.31) CN1_76(74.355,2.69) CN1_77(75.625,7.31) CN1_78(75.625,2.69) CN1_79(76.895,7.31) CN1_80(76.895,2.69) CN2_1(27.365,60.31) CN2_2(27.365,55.69) CN2_3(28.635,60.31) CN2_4(28.635,55.69) CN2_5(29.905,60.31) CN2_6(29.905,55.69) CN2_7(31.175,60.31) CN2_8(31.175,55.69) CN2_9(32.445,60.31) CN2_10(32.445,55.69) CN2_11(33.715,60.31) CN2_12(33.715,55.69) CN2_13(34.985,60.31) CN2_14(34.985,55.69) CN2_15(36.255,60.31) CN2_16(36.255,55.69) CN2_17(37.525,60.31) CN2_18(37.525,55.69) CN2_19(38.795,60.31) CN2_20(38.795,55.69) CN2_21(40.065,60.31) CN2_22(40.065,55.69) CN2_23(41.335,60.31) CN2_24(41.335,55.69) CN2_25(42.605,60.31) CN2_26(42.605,55.69) CN2_27(43.875,60.31) CN2_28(43.875,55.69) CN2_29(45.145,60.31) CN2_30(45.145,55.69) CN2_31(46.415,60.31) CN2_32(46.415,55.69) CN2_33(47.685,60.31) CN2_34(47.685,55.69) CN2_35(48.955,60.31) CN2_36(48.955,55.69) CN2_37(50.225,60.31) CN2_38(50.225,55.69) CN2_39(51.495,60.31) CN2_40(51.495,55.69) CN2_41(52.765,60.31) CN2_42(52.765,55.69) CN2_43(54.035,60.31) CN2_44(54.035,55.69) CN2_45(55.305,60.31) CN2_46(55.305,55.69) CN2_47(56.575,60.31) CN2_48(56.575,55.69) CN2_49(57.845,60.31) CN2_50(57.845,55.69) CN2_51(59.115,60.31) CN2_52(59.115,55.69) CN2_53(60.385,60.31) CN2_54(60.385,55.69) CN2_55(61.655,60.31) CN2_56(61.655,55.69) CN2_57(62.925,60.31) CN2_58(62.925,55.69) CN2_59(64.195,60.31) CN2_60(64.195,55.69) CN2_61(65.465,60.31) CN2_62(65.465,55.69) CN2_63(66.735,60.31) CN2_64(66.735,55.69) CN2_65(68.005,60.31) CN2_66(68.005,55.69) CN2_67(69.275,60.31) CN2_68(69.275,55.69) CN2_69(70.545,60.31) CN2_70(70.545,55.69) CN2_71(71.815,60.31) CN2_72(71.815,55.69) CN2_73(73.085,60.31) CN2_74(73.085,55.69) CN2_75(74.355,60.31) CN2_76(74.355,55.69) CN2_77(75.625,60.31) CN2_78(75.625,55.69) CN2_79(76.895,60.31) CN2_80(76.895,55.69)
Top Overlay:
  lines w0.152: 25.054,4.046 25.054,2.03 26.651,2.03 ; 25.054,5.956 25.054,7.999 26.651,7.999 ; 25.054,57.046 25.054,55.03 26.651,55.03 ; 25.054,58.956 25.054,60.999 26.651,60.999 ; 77.609,2.03 79.206,2.03 79.206,4.046 ; 77.609,7.999 79.206,7.999 79.206,5.956 ; 77.609,55.03 79.206,55.03 79.206,57.046 ; 77.609,60.999 79.206,60.999 79.206,58.956
  text "CN2" at 24,59 h1.52
  text "CN1" at 23.983,6 h1.52
  text "1" at 24,55 h3
  text "80" at 80,59.033 h3
  text "80" at 80,6.033 h3
  text "1" at 24,2 h3
Mechanical 5:
  lines w0.254: 0,0 0,63 102,63 102,0 0,0
3D body "c-0104656-08-3-j1-3d.stp": height 7.62, standoff -1.21, extent 25.174,1.384 79.073,8.623
3D body "c-0104656-08-3-j1-3d.stp": height 7.62, standoff -1.21, extent 25.174,54.369 79.073,61.608